# Altium footprint library connectors_USB_ETH.PcbLib: 71 footprints (part 5 of 5)
Each footprint in its own frame and in the unit in brackets; x right, y up, seen from the top. Pads: shape width x height; smd on the part's side, far side on the other; paste and mask are expansions set on the pad; w line width, h text height; cw(c..) or ccw(c..) is an arc to the next point about the centre after c.
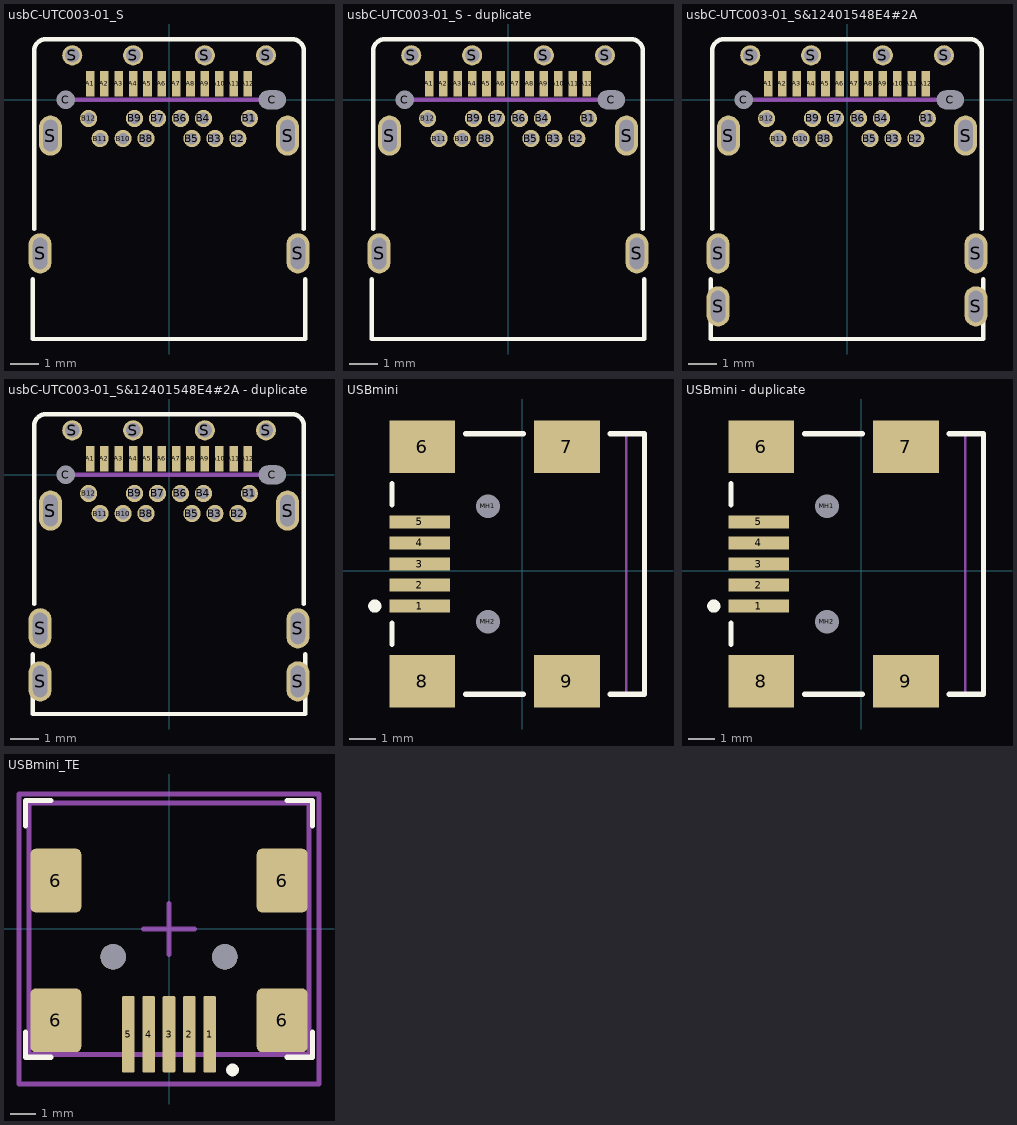
[diagram p4: the footprints below, top view; thin cyan lines are the x and y axes]

## usbC-UTC003-01_S [mm]
height 1.2
pads (34):
  rect 0.3x0.9 smd: A1(-2.75,0.56) A2(-2.25,0.56) A3(-1.75,0.56) A4(-1.25,0.56) A5(-0.75,0.56) A6(-0.25,0.56) A7(0.25,0.56) A8(0.75,0.56) A9(1.25,0.56) A10(1.75,0.56) A11(2.25,0.56) A12(2.75,0.56)
  round 0.6 hole 0.4: B1(2.8,-0.65) B2(2.4,-1.35) B3(1.6,-1.35) B4(1.2,-0.65) B5(0.8,-1.35) B6(0.4,-0.65) B7(-0.4,-0.65) B8(-0.8,-1.35) B9(-1.2,-0.65) B10(-1.6,-1.35) B11(-2.4,-1.35) B12(-2.8,-0.65)
  round 0.5 hole 0.65 unplated: C(-3.6,0)
  round 0.5 hole 0.65 slot 0.95 at 0 deg unplated: C(3.6,0)
  oval 0.8x1.4 hole 0.5 slot 1.1 at 90 deg: S(-4.49,-5.35) S(-4.13,-1.25) S(4.13,-1.25) S(4.49,-5.35)
  round 0.7 hole 0.5: S(-3.37,1.55) S(-1.25,1.55) S(1.25,1.55) S(3.38,1.55)
Top Overlay:
  lines w0.15: -4.75,-6.25 -4.75,-8.335 4.75,-8.335 4.75,-6.25 ; -4.7,-4.5 -4.7,0.61 -4.7,1.71 -4.7,1.714 cw(c-4.352,1.71) -4.699,1.729 cw(c-4.349,1.71) -4.699,1.742 cw(c-4.345,1.709) -4.697,1.753 cw(c-4.341,1.709) -4.696,1.764 cw(c-4.338,1.708) -4.694,1.773 cw(c-4.334,1.708) -4.692,1.783 cw(c-4.33,1.707) -4.69,1.792 cw(c-4.327,1.706) -4.688,1.801 cw(c-4.323,1.705) -4.686,1.81 cw(c-4.319,1.704) -4.683,1.819 cw(c-4.315,1.703) -4.68,1.828 cw(c-4.311,1.701) -4.677,1.837 cw(c-4.308,1.7) -4.673,1.845 cw(c-4.304,1.699) -4.67,1.854 cw(c-4.3,1.697) -4.666,1.863 cw(c-4.296,1.695) -4.662,1.872 cw(c-4.293,1.693) -4.657,1.882 cw(c-4.289,1.691) -4.652,1.891 cw(c-4.285,1.689) -4.646,1.902 cw(c-4.281,1.687) -4.639,1.913 cw(c-4.278,1.685) -4.631,1.925 cw(c-4.274,1.682) -4.621,1.939 cw(c-4.267,1.677) -4.547,2.017 cw(c-4.27,1.68) -4.529,2.031 cw(c-4.272,1.684) -4.514,2.041 cw(c-4.275,1.688) -4.502,2.049 cw(c-4.277,1.691) -4.491,2.056 cw(c-4.28,1.695) -4.481,2.062 cw(c-4.282,1.699) -4.471,2.067 cw(c-4.284,1.703) -4.462,2.072 cw(c-4.285,1.707) -4.453,2.076 cw(c-4.287,1.71) -4.443,2.08 cw(c-4.289,1.714) -4.435,2.084 cw(c-4.29,1.718) -4.426,2.087 cw(c-4.292,1.722) -4.417,2.09 cw(c-4.293,1.726) -4.408,2.093 cw(c-4.294,1.729) -4.4,2.096 cw(c-4.295,1.733) -4.391,2.098 cw(c-4.296,1.737) -4.382,2.1 cw(c-4.297,1.741) -4.372,2.102 cw(c-4.298,1.744) -4.363,2.104 cw(c-4.299,1.748) -4.352,2.106 cw(c-4.299,1.752) -4.341,2.108 cw(c-4.3,1.756) -4.329,2.109 cw(c-4.3,1.759) -4.316,2.11 cw(c-4.3,1.763) -4.3,2.11 4.3,2.11 4.304,2.11 cw(c4.3,1.762) 4.319,2.109 cw(c4.3,1.759) 4.332,2.109 cw(c4.299,1.755) 4.343,2.107 cw(c4.299,1.751) 4.354,2.106 cw(c4.298,1.748) 4.363,2.104 cw(c4.298,1.744) 4.373,2.102 cw(c4.297,1.74) 4.382,2.1 cw(c4.296,1.737) 4.391,2.098 cw(c4.295,1.733) 4.4,2.096 cw(c4.294,1.729) 4.409,2.093 cw(c4.293,1.725) 4.418,2.09 cw(c4.291,1.721) 4.427,2.087 cw(c4.29,1.718) 4.435,2.083 cw(c4.289,1.714) 4.444,2.08 cw(c4.287,1.71) 4.453,2.076 cw(c4.285,1.706) 4.462,2.072 cw(c4.283,1.703) 4.472,2.067 cw(c4.281,1.699) 4.481,2.062 cw(c4.279,1.695) 4.492,2.056 cw(c4.277,1.691) 4.503,2.049 cw(c4.275,1.688) 4.515,2.041 cw(c4.272,1.684) 4.529,2.031 cw(c4.267,1.677) 4.607,1.957 cw(c4.27,1.68) 4.621,1.939 cw(c4.274,1.682) 4.631,1.924 cw(c4.278,1.685) 4.639,1.912 cw(c4.281,1.687) 4.646,1.901 cw(c4.285,1.689) 4.652,1.891 cw(c4.289,1.692) 4.657,1.881 cw(c4.293,1.694) 4.662,1.872 cw(c4.297,1.695) 4.666,1.863 cw(c4.3,1.697) 4.67,1.853 cw(c4.304,1.699) 4.674,1.845 cw(c4.308,1.7) 4.677,1.836 cw(c4.312,1.702) 4.68,1.827 cw(c4.316,1.703) 4.683,1.818 cw(c4.319,1.704) 4.686,1.81 cw(c4.323,1.705) 4.688,1.801 cw(c4.327,1.706) 4.69,1.792 cw(c4.331,1.707) 4.692,1.782 cw(c4.334,1.708) 4.694,1.773 cw(c4.338,1.708) 4.696,1.762 cw(c4.342,1.709) 4.698,1.751 cw(c4.346,1.71) 4.699,1.739 cw(c4.349,1.71) 4.7,1.726 cw(c4.353,1.71) 4.7,1.71 4.7,0.61 4.7,-4.5
Mechanical 13:
  lines w0.15: -3.6,0 3.6,0
3D body "utc003-01_2.STEP": height 3.08, standoff -1.16, extent -4.61,-8.335 4.61,1.725

## usbC-UTC003-01_S - duplicate [mm]
height 1.2
pads (34):
  rect 0.3x0.9 smd: A1(-2.75,0.56) A2(-2.25,0.56) A3(-1.75,0.56) A4(-1.25,0.56) A5(-0.75,0.56) A6(-0.25,0.56) A7(0.25,0.56) A8(0.75,0.56) A9(1.25,0.56) A10(1.75,0.56) A11(2.25,0.56) A12(2.75,0.56)
  round 0.6 hole 0.4: B1(2.8,-0.65) B2(2.4,-1.35) B3(1.6,-1.35) B4(1.2,-0.65) B5(0.8,-1.35) B6(0.4,-0.65) B7(-0.4,-0.65) B8(-0.8,-1.35) B9(-1.2,-0.65) B10(-1.6,-1.35) B11(-2.4,-1.35) B12(-2.8,-0.65)
  round 0.5 hole 0.65 unplated: C(-3.6,0)
  round 0.5 hole 0.65 slot 0.95 at 0 deg unplated: C(3.6,0)
  oval 0.8x1.4 hole 0.5 slot 1.1 at 90 deg: S(-4.49,-5.35) S(-4.13,-1.25) S(4.13,-1.25) S(4.49,-5.35)
  round 0.7 hole 0.5: S(-3.37,1.55) S(-1.25,1.55) S(1.25,1.55) S(3.38,1.55)
Top Overlay:
  lines w0.15: -4.75,-6.25 -4.75,-8.335 4.75,-8.335 4.75,-6.25 ; -4.7,-4.5 -4.7,0.61 -4.7,1.71 -4.7,1.714 cw(c-4.352,1.71) -4.699,1.729 cw(c-4.349,1.71) -4.699,1.742 cw(c-4.345,1.709) -4.697,1.753 cw(c-4.341,1.709) -4.696,1.764 cw(c-4.338,1.708) -4.694,1.773 cw(c-4.334,1.708) -4.692,1.783 cw(c-4.33,1.707) -4.69,1.792 cw(c-4.327,1.706) -4.688,1.801 cw(c-4.323,1.705) -4.686,1.81 cw(c-4.319,1.704) -4.683,1.819 cw(c-4.315,1.703) -4.68,1.828 cw(c-4.311,1.701) -4.677,1.837 cw(c-4.308,1.7) -4.673,1.845 cw(c-4.304,1.699) -4.67,1.854 cw(c-4.3,1.697) -4.666,1.863 cw(c-4.296,1.695) -4.662,1.872 cw(c-4.293,1.693) -4.657,1.882 cw(c-4.289,1.691) -4.652,1.891 cw(c-4.285,1.689) -4.646,1.902 cw(c-4.281,1.687) -4.639,1.913 cw(c-4.278,1.685) -4.631,1.925 cw(c-4.274,1.682) -4.621,1.939 cw(c-4.267,1.677) -4.547,2.017 cw(c-4.27,1.68) -4.529,2.031 cw(c-4.272,1.684) -4.514,2.041 cw(c-4.275,1.688) -4.502,2.049 cw(c-4.277,1.691) -4.491,2.056 cw(c-4.28,1.695) -4.481,2.062 cw(c-4.282,1.699) -4.471,2.067 cw(c-4.284,1.703) -4.462,2.072 cw(c-4.285,1.707) -4.453,2.076 cw(c-4.287,1.71) -4.443,2.08 cw(c-4.289,1.714) -4.435,2.084 cw(c-4.29,1.718) -4.426,2.087 cw(c-4.292,1.722) -4.417,2.09 cw(c-4.293,1.726) -4.408,2.093 cw(c-4.294,1.729) -4.4,2.096 cw(c-4.295,1.733) -4.391,2.098 cw(c-4.296,1.737) -4.382,2.1 cw(c-4.297,1.741) -4.372,2.102 cw(c-4.298,1.744) -4.363,2.104 cw(c-4.299,1.748) -4.352,2.106 cw(c-4.299,1.752) -4.341,2.108 cw(c-4.3,1.756) -4.329,2.109 cw(c-4.3,1.759) -4.316,2.11 cw(c-4.3,1.763) -4.3,2.11 4.3,2.11 4.304,2.11 cw(c4.3,1.762) 4.319,2.109 cw(c4.3,1.759) 4.332,2.109 cw(c4.299,1.755) 4.343,2.107 cw(c4.299,1.751) 4.354,2.106 cw(c4.298,1.748) 4.363,2.104 cw(c4.298,1.744) 4.373,2.102 cw(c4.297,1.74) 4.382,2.1 cw(c4.296,1.737) 4.391,2.098 cw(c4.295,1.733) 4.4,2.096 cw(c4.294,1.729) 4.409,2.093 cw(c4.293,1.725) 4.418,2.09 cw(c4.291,1.721) 4.427,2.087 cw(c4.29,1.718) 4.435,2.083 cw(c4.289,1.714) 4.444,2.08 cw(c4.287,1.71) 4.453,2.076 cw(c4.285,1.706) 4.462,2.072 cw(c4.283,1.703) 4.472,2.067 cw(c4.281,1.699) 4.481,2.062 cw(c4.279,1.695) 4.492,2.056 cw(c4.277,1.691) 4.503,2.049 cw(c4.275,1.688) 4.515,2.041 cw(c4.272,1.684) 4.529,2.031 cw(c4.267,1.677) 4.607,1.957 cw(c4.27,1.68) 4.621,1.939 cw(c4.274,1.682) 4.631,1.924 cw(c4.278,1.685) 4.639,1.912 cw(c4.281,1.687) 4.646,1.901 cw(c4.285,1.689) 4.652,1.891 cw(c4.289,1.692) 4.657,1.881 cw(c4.293,1.694) 4.662,1.872 cw(c4.297,1.695) 4.666,1.863 cw(c4.3,1.697) 4.67,1.853 cw(c4.304,1.699) 4.674,1.845 cw(c4.308,1.7) 4.677,1.836 cw(c4.312,1.702) 4.68,1.827 cw(c4.316,1.703) 4.683,1.818 cw(c4.319,1.704) 4.686,1.81 cw(c4.323,1.705) 4.688,1.801 cw(c4.327,1.706) 4.69,1.792 cw(c4.331,1.707) 4.692,1.782 cw(c4.334,1.708) 4.694,1.773 cw(c4.338,1.708) 4.696,1.762 cw(c4.342,1.709) 4.698,1.751 cw(c4.346,1.71) 4.699,1.739 cw(c4.349,1.71) 4.7,1.726 cw(c4.353,1.71) 4.7,1.71 4.7,0.61 4.7,-4.5
Mechanical 13:
  lines w0.15: -3.6,0 3.6,0
3D body "utc003-01_2.STEP": height 3.08, standoff -1.16, extent -4.61,-8.335 4.61,1.725

## usbC-UTC003-01_S&12401548E4#2A [mm]
height 1.2
pads (36):
  rect 0.3x0.9 smd: A1(-2.75,0.56) A2(-2.25,0.56) A3(-1.75,0.56) A4(-1.25,0.56) A5(-0.75,0.56) A6(-0.25,0.56) A7(0.25,0.56) A8(0.75,0.56) A9(1.25,0.56) A10(1.75,0.56) A11(2.25,0.56) A12(2.75,0.56)
  round 0.6 hole 0.4: B1(2.8,-0.65) B2(2.4,-1.35) B3(1.6,-1.35) B4(1.2,-0.65) B5(0.8,-1.35) B6(0.4,-0.65) B7(-0.4,-0.65) B8(-0.8,-1.35) B9(-1.2,-0.65) B10(-1.6,-1.35) B11(-2.4,-1.35) B12(-2.8,-0.65)
  round 0.5 hole 0.65 unplated: C(-3.6,0)
  round 0.5 hole 0.65 slot 0.95 at 0 deg unplated: C(3.6,0)
  oval 0.8x1.4 hole 0.5 slot 1.1 at 90 deg: S(-4.49,-7.2) S(-4.49,-5.35) S(-4.13,-1.25) S(4.13,-1.25) S(4.49,-7.2) S(4.49,-5.35)
  round 0.7 hole 0.5: S(-3.37,1.55) S(-1.25,1.55) S(1.25,1.55) S(3.38,1.55)
Top Overlay:
  lines w0.15: -4.75,-6.25 -4.75,-8.335 4.75,-8.335 4.75,-6.25 ; -4.7,-4.5 -4.7,0.61 -4.7,1.71 -4.7,1.714 cw(c-4.352,1.71) -4.699,1.729 cw(c-4.349,1.71) -4.699,1.742 cw(c-4.345,1.709) -4.697,1.753 cw(c-4.341,1.709) -4.696,1.764 cw(c-4.338,1.708) -4.694,1.773 cw(c-4.334,1.708) -4.692,1.783 cw(c-4.33,1.707) -4.69,1.792 cw(c-4.327,1.706) -4.688,1.801 cw(c-4.323,1.705) -4.686,1.81 cw(c-4.319,1.704) -4.683,1.819 cw(c-4.315,1.703) -4.68,1.828 cw(c-4.311,1.701) -4.677,1.837 cw(c-4.308,1.7) -4.673,1.845 cw(c-4.304,1.699) -4.67,1.854 cw(c-4.3,1.697) -4.666,1.863 cw(c-4.296,1.695) -4.662,1.872 cw(c-4.293,1.693) -4.657,1.882 cw(c-4.289,1.691) -4.652,1.891 cw(c-4.285,1.689) -4.646,1.902 cw(c-4.281,1.687) -4.639,1.913 cw(c-4.278,1.685) -4.631,1.925 cw(c-4.274,1.682) -4.621,1.939 cw(c-4.267,1.677) -4.547,2.017 cw(c-4.27,1.68) -4.529,2.031 cw(c-4.272,1.684) -4.514,2.041 cw(c-4.275,1.688) -4.502,2.049 cw(c-4.277,1.691) -4.491,2.056 cw(c-4.28,1.695) -4.481,2.062 cw(c-4.282,1.699) -4.471,2.067 cw(c-4.284,1.703) -4.462,2.072 cw(c-4.285,1.707) -4.453,2.076 cw(c-4.287,1.71) -4.443,2.08 cw(c-4.289,1.714) -4.435,2.084 cw(c-4.29,1.718) -4.426,2.087 cw(c-4.292,1.722) -4.417,2.09 cw(c-4.293,1.726) -4.408,2.093 cw(c-4.294,1.729) -4.4,2.096 cw(c-4.295,1.733) -4.391,2.098 cw(c-4.296,1.737) -4.382,2.1 cw(c-4.297,1.741) -4.372,2.102 cw(c-4.298,1.744) -4.363,2.104 cw(c-4.299,1.748) -4.352,2.106 cw(c-4.299,1.752) -4.341,2.108 cw(c-4.3,1.756) -4.329,2.109 cw(c-4.3,1.759) -4.316,2.11 cw(c-4.3,1.763) -4.3,2.11 4.3,2.11 4.304,2.11 cw(c4.3,1.762) 4.319,2.109 cw(c4.3,1.759) 4.332,2.109 cw(c4.299,1.755) 4.343,2.107 cw(c4.299,1.751) 4.354,2.106 cw(c4.298,1.748) 4.363,2.104 cw(c4.298,1.744) 4.373,2.102 cw(c4.297,1.74) 4.382,2.1 cw(c4.296,1.737) 4.391,2.098 cw(c4.295,1.733) 4.4,2.096 cw(c4.294,1.729) 4.409,2.093 cw(c4.293,1.725) 4.418,2.09 cw(c4.291,1.721) 4.427,2.087 cw(c4.29,1.718) 4.435,2.083 cw(c4.289,1.714) 4.444,2.08 cw(c4.287,1.71) 4.453,2.076 cw(c4.285,1.706) 4.462,2.072 cw(c4.283,1.703) 4.472,2.067 cw(c4.281,1.699) 4.481,2.062 cw(c4.279,1.695) 4.492,2.056 cw(c4.277,1.691) 4.503,2.049 cw(c4.275,1.688) 4.515,2.041 cw(c4.272,1.684) 4.529,2.031 cw(c4.267,1.677) 4.607,1.957 cw(c4.27,1.68) 4.621,1.939 cw(c4.274,1.682) 4.631,1.924 cw(c4.278,1.685) 4.639,1.912 cw(c4.281,1.687) 4.646,1.901 cw(c4.285,1.689) 4.652,1.891 cw(c4.289,1.692) 4.657,1.881 cw(c4.293,1.694) 4.662,1.872 cw(c4.297,1.695) 4.666,1.863 cw(c4.3,1.697) 4.67,1.853 cw(c4.304,1.699) 4.674,1.845 cw(c4.308,1.7) 4.677,1.836 cw(c4.312,1.702) 4.68,1.827 cw(c4.316,1.703) 4.683,1.818 cw(c4.319,1.704) 4.686,1.81 cw(c4.323,1.705) 4.688,1.801 cw(c4.327,1.706) 4.69,1.792 cw(c4.331,1.707) 4.692,1.782 cw(c4.334,1.708) 4.694,1.773 cw(c4.338,1.708) 4.696,1.762 cw(c4.342,1.709) 4.698,1.751 cw(c4.346,1.71) 4.699,1.739 cw(c4.349,1.71) 4.7,1.726 cw(c4.353,1.71) 4.7,1.71 4.7,0.61 4.7,-4.5
Mechanical 13:
  lines w0.15: -3.6,0 3.6,0
3D body "M-12401548E4#2A-REVT1.STEP": height 3.27, standoff -0.91, extent -4.6,-9.575 4.6,0.925

## usbC-UTC003-01_S&12401548E4#2A - duplicate [mm]
height 1.2
pads (36):
  rect 0.3x0.9 smd: A1(-2.75,0.56) A2(-2.25,0.56) A3(-1.75,0.56) A4(-1.25,0.56) A5(-0.75,0.56) A6(-0.25,0.56) A7(0.25,0.56) A8(0.75,0.56) A9(1.25,0.56) A10(1.75,0.56) A11(2.25,0.56) A12(2.75,0.56)
  round 0.6 hole 0.4: B1(2.8,-0.65) B2(2.4,-1.35) B3(1.6,-1.35) B4(1.2,-0.65) B5(0.8,-1.35) B6(0.4,-0.65) B7(-0.4,-0.65) B8(-0.8,-1.35) B9(-1.2,-0.65) B10(-1.6,-1.35) B11(-2.4,-1.35) B12(-2.8,-0.65)
  round 0.5 hole 0.65 unplated: C(-3.6,0)
  round 0.5 hole 0.65 slot 0.95 at 0 deg unplated: C(3.6,0)
  oval 0.8x1.4 hole 0.5 slot 1.1 at 90 deg: S(-4.49,-7.2) S(-4.49,-5.35) S(-4.13,-1.25) S(4.13,-1.25) S(4.49,-7.2) S(4.49,-5.35)
  round 0.7 hole 0.5: S(-3.37,1.55) S(-1.25,1.55) S(1.25,1.55) S(3.38,1.55)
Top Overlay:
  lines w0.15: -4.75,-6.25 -4.75,-8.335 4.75,-8.335 4.75,-6.25 ; -4.7,-4.5 -4.7,0.61 -4.7,1.71 -4.7,1.714 cw(c-4.352,1.71) -4.699,1.729 cw(c-4.349,1.71) -4.699,1.742 cw(c-4.345,1.709) -4.697,1.753 cw(c-4.341,1.709) -4.696,1.764 cw(c-4.338,1.708) -4.694,1.773 cw(c-4.334,1.708) -4.692,1.783 cw(c-4.33,1.707) -4.69,1.792 cw(c-4.327,1.706) -4.688,1.801 cw(c-4.323,1.705) -4.686,1.81 cw(c-4.319,1.704) -4.683,1.819 cw(c-4.315,1.703) -4.68,1.828 cw(c-4.311,1.701) -4.677,1.837 cw(c-4.308,1.7) -4.673,1.845 cw(c-4.304,1.699) -4.67,1.854 cw(c-4.3,1.697) -4.666,1.863 cw(c-4.296,1.695) -4.662,1.872 cw(c-4.293,1.693) -4.657,1.882 cw(c-4.289,1.691) -4.652,1.891 cw(c-4.285,1.689) -4.646,1.902 cw(c-4.281,1.687) -4.639,1.913 cw(c-4.278,1.685) -4.631,1.925 cw(c-4.274,1.682) -4.621,1.939 cw(c-4.267,1.677) -4.547,2.017 cw(c-4.27,1.68) -4.529,2.031 cw(c-4.272,1.684) -4.514,2.041 cw(c-4.275,1.688) -4.502,2.049 cw(c-4.277,1.691) -4.491,2.056 cw(c-4.28,1.695) -4.481,2.062 cw(c-4.282,1.699) -4.471,2.067 cw(c-4.284,1.703) -4.462,2.072 cw(c-4.285,1.707) -4.453,2.076 cw(c-4.287,1.71) -4.443,2.08 cw(c-4.289,1.714) -4.435,2.084 cw(c-4.29,1.718) -4.426,2.087 cw(c-4.292,1.722) -4.417,2.09 cw(c-4.293,1.726) -4.408,2.093 cw(c-4.294,1.729) -4.4,2.096 cw(c-4.295,1.733) -4.391,2.098 cw(c-4.296,1.737) -4.382,2.1 cw(c-4.297,1.741) -4.372,2.102 cw(c-4.298,1.744) -4.363,2.104 cw(c-4.299,1.748) -4.352,2.106 cw(c-4.299,1.752) -4.341,2.108 cw(c-4.3,1.756) -4.329,2.109 cw(c-4.3,1.759) -4.316,2.11 cw(c-4.3,1.763) -4.3,2.11 4.3,2.11 4.304,2.11 cw(c4.3,1.762) 4.319,2.109 cw(c4.3,1.759) 4.332,2.109 cw(c4.299,1.755) 4.343,2.107 cw(c4.299,1.751) 4.354,2.106 cw(c4.298,1.748) 4.363,2.104 cw(c4.298,1.744) 4.373,2.102 cw(c4.297,1.74) 4.382,2.1 cw(c4.296,1.737) 4.391,2.098 cw(c4.295,1.733) 4.4,2.096 cw(c4.294,1.729) 4.409,2.093 cw(c4.293,1.725) 4.418,2.09 cw(c4.291,1.721) 4.427,2.087 cw(c4.29,1.718) 4.435,2.083 cw(c4.289,1.714) 4.444,2.08 cw(c4.287,1.71) 4.453,2.076 cw(c4.285,1.706) 4.462,2.072 cw(c4.283,1.703) 4.472,2.067 cw(c4.281,1.699) 4.481,2.062 cw(c4.279,1.695) 4.492,2.056 cw(c4.277,1.691) 4.503,2.049 cw(c4.275,1.688) 4.515,2.041 cw(c4.272,1.684) 4.529,2.031 cw(c4.267,1.677) 4.607,1.957 cw(c4.27,1.68) 4.621,1.939 cw(c4.274,1.682) 4.631,1.924 cw(c4.278,1.685) 4.639,1.912 cw(c4.281,1.687) 4.646,1.901 cw(c4.285,1.689) 4.652,1.891 cw(c4.289,1.692) 4.657,1.881 cw(c4.293,1.694) 4.662,1.872 cw(c4.297,1.695) 4.666,1.863 cw(c4.3,1.697) 4.67,1.853 cw(c4.304,1.699) 4.674,1.845 cw(c4.308,1.7) 4.677,1.836 cw(c4.312,1.702) 4.68,1.827 cw(c4.316,1.703) 4.683,1.818 cw(c4.319,1.704) 4.686,1.81 cw(c4.323,1.705) 4.688,1.801 cw(c4.327,1.706) 4.69,1.792 cw(c4.331,1.707) 4.692,1.782 cw(c4.334,1.708) 4.694,1.773 cw(c4.338,1.708) 4.696,1.762 cw(c4.342,1.709) 4.698,1.751 cw(c4.346,1.71) 4.699,1.739 cw(c4.349,1.71) 4.7,1.726 cw(c4.353,1.71) 4.7,1.71 4.7,0.61 4.7,-4.5
Mechanical 13:
  lines w0.15: -3.6,0 3.6,0
3D body "M-12401548E4#2A-REVT1.STEP": height 3.27, standoff -0.91, extent -4.6,-9.575 4.6,0.925

## USBmini [mm] "mini USB"
pads (11):
  rect 2.3x0.5 smd: 1(-3.913,-1.346) 2(-3.913,-0.546) 3(-3.913,0.254) 4(-3.913,1.054) 5(-3.913,1.854)
  rect 2.5x2 smd: 6(-3.813,4.704) 7(1.687,4.704) 8(-3.813,-4.196) 9(1.687,-4.196)
  round 0.6 hole 0.9 unplated: MH1(-1.313,2.454) MH2(-1.313,-1.946)
Top Overlay:
  circle w0.25: c-5.613,-1.346 r0.125
  lines w0.2: -4.963,-2.796 -4.963,-1.996 ; -4.963,2.504 -4.963,3.304 ; -2.163,-4.696 0.037,-4.696 ; -2.163,5.204 0.037,5.204 ; 3.337,-4.696 4.637,-4.696 4.637,5.204 3.337,5.204
M1_3D_TOP:
  lines w0.1: 3.937,-4.696 3.937,5.204
  text "PCB Edge" at 4.369,-3.782 h0.25
3D body "c-1734035-1-f-3d.stp": height 4.14, standoff -0.95, extent -4.625,-4.7 4.575,5.2

## USBmini - duplicate [mm] "mini USB"
pads (11):
  rect 2.3x0.5 smd: 1(-3.913,-1.346) 2(-3.913,-0.546) 3(-3.913,0.254) 4(-3.913,1.054) 5(-3.913,1.854)
  rect 2.5x2 smd: 6(-3.813,4.704) 7(1.687,4.704) 8(-3.813,-4.196) 9(1.687,-4.196)
  round 0.6 hole 0.9 unplated: MH1(-1.313,2.454) MH2(-1.313,-1.946)
Top Overlay:
  circle w0.25: c-5.613,-1.346 r0.125
  lines w0.2: -4.963,-2.796 -4.963,-1.996 ; -4.963,2.504 -4.963,3.304 ; -2.163,-4.696 0.037,-4.696 ; -2.163,5.204 0.037,5.204 ; 3.337,-4.696 4.637,-4.696 4.637,5.204 3.337,5.204
M1_3D_TOP:
  lines w0.1: 3.937,-4.696 3.937,5.204
  text "PCB Edge" at 4.369,-3.782 h0.25
3D body "c-1734035-1-f-3d.stp": height 4.14, standoff -0.95, extent -4.625,-4.7 4.575,5.2

## USBmini_TE [mm] "1734035-1 TE Connectivity (Tyco) Mini USB 2.0 Type B RCP 5 POS 0.8mm Solder RA SMD 5 Terminal 1 Port Tray"
height 3.95
pads (11):
  rrect20% 0.5x3 smd: 1(1.6,-4.15) 2(0.8,-4.15) 3(0,-4.15) 4(-0.8,-4.15) 5(-1.6,-4.15)
  rrect20% 2x2.5 smd: 6(-4.45,-3.6) 6(-4.45,1.9) 6(4.45,-3.6) 6(4.45,1.9)
  round 1 hole 1 unplated: ""(-2.2,-1.1) ""(2.2,-1.1)
Top Overlay:
  circle w0.25: c2.5,-5.55 r0.125
  lines w0.2: -5.65,-4.05 -5.65,-5.05 -4.65,-5.05 ; -5.65,4.05 -5.65,5.05 -4.65,5.05 ; 4.65,-5.05 5.65,-5.05 5.65,-4.05 ; 4.65,5.05 5.65,5.05 5.65,4.05
M3_comm_top:
  text ".comment" at -2.8,-0.2 h2
M5_asm_top:
  lines w0.2: -5.5,-4.95 5.5,-4.95 5.5,4.95 -5.5,4.95 -5.5,-4.95
  text ".Designator" at -3.4,5.9 h2
M7_courtyard_top:
  lines w0.2: -1,0 1,0 ; 0,-1 0,1 ; -5.9,-6.1 -5.9,5.3 5.9,5.3 5.9,-6.1 -5.9,-6.1
3D body "1734035-1.step": height 4.14, standoff -0.95, extent -4.95,-4.4 4.95,4.8